# Altium footprint library HexapodRobot_STC15W4K48S4.PcbLib: 92 footprints (part 3 of 6)
Each footprint in its own frame and in the unit in brackets; x right, y up, seen from the top. Pads: shape width x height; smd on the part's side, far side on the other; paste and mask are expansions set on the pad; w line width, h text height; cw(c..) or ccw(c..) is an arc to the next point about the centre after c.
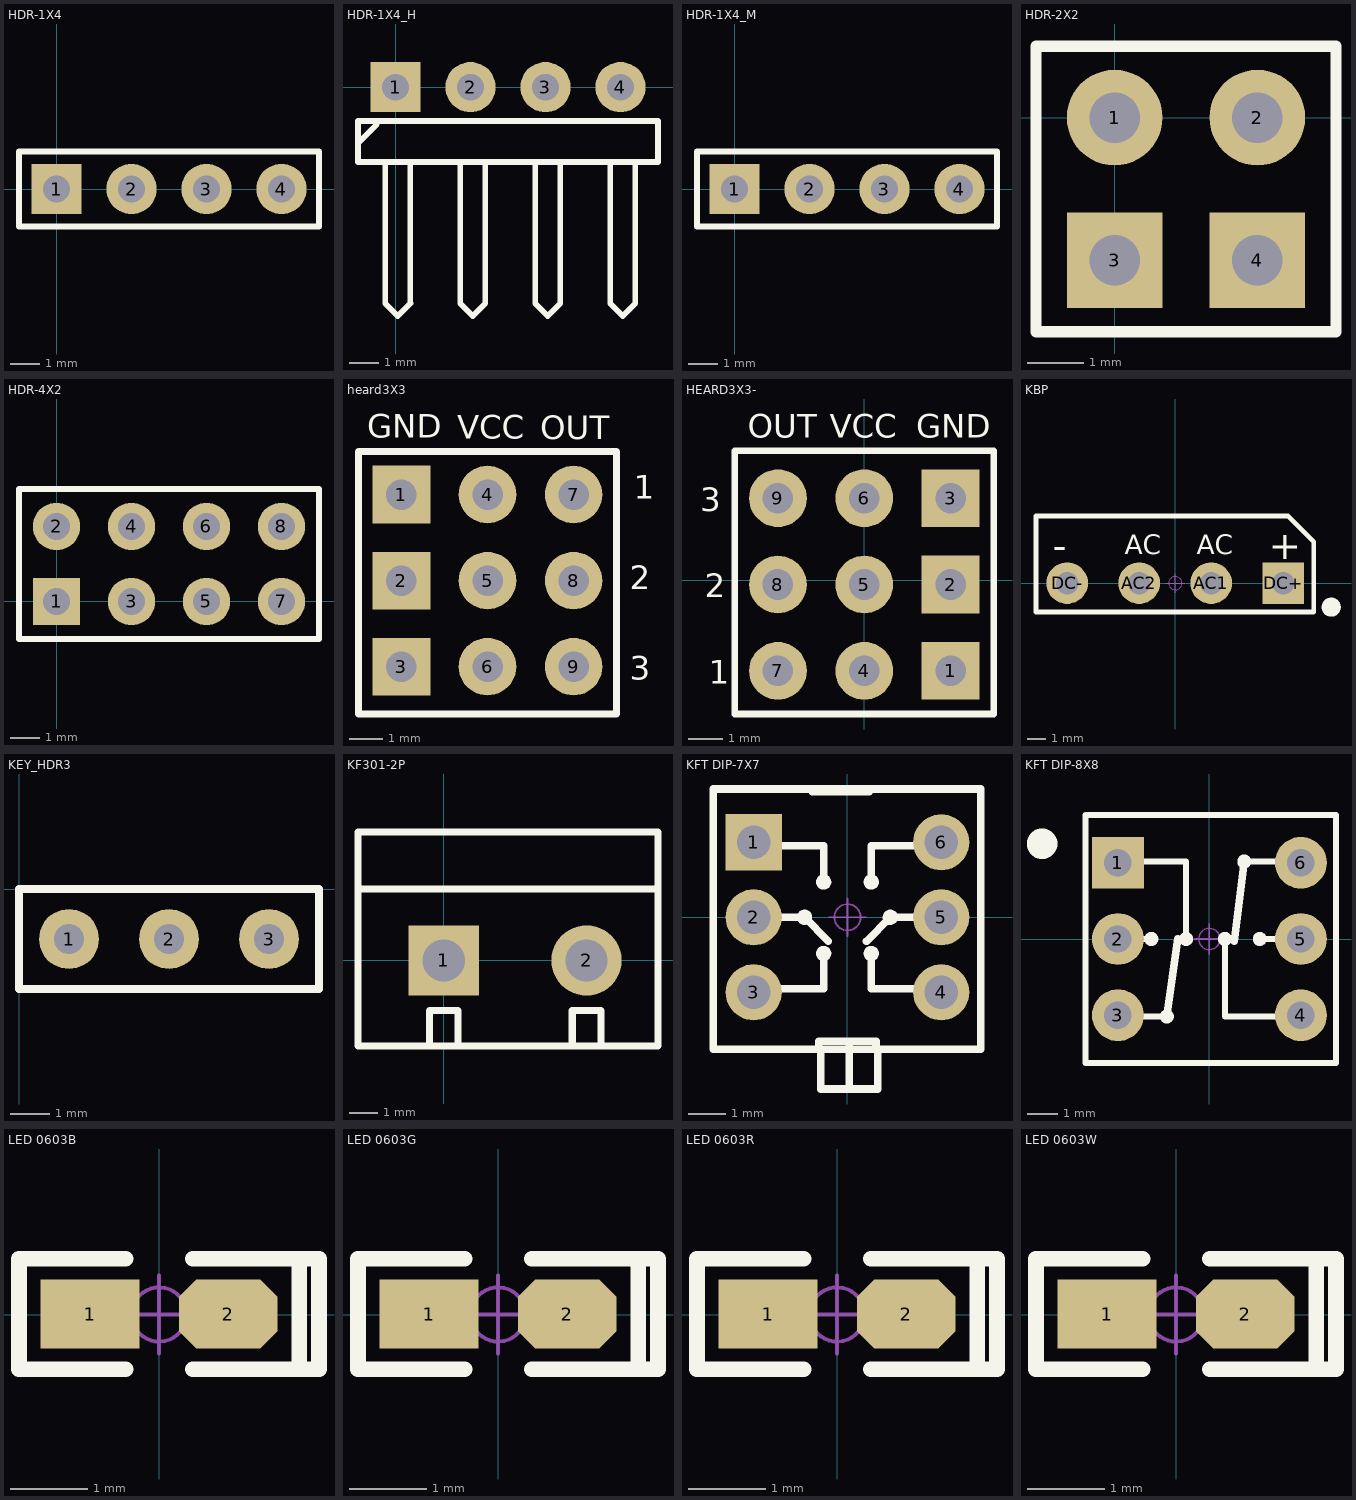
[diagram p2: the footprints below, top view; thin cyan lines are the x and y axes]

## HDR-1X4 [mm] "排针，4脚"
pads (4):
  rect 1.7x1.7 hole 0.9: 1(0,0)
  round 1.7 hole 0.9: 2(2.54,0) 3(5.08,0) 4(7.62,0)
Top Overlay:
  lines w0.2: -1.27,-1.27 -1.27,1.27 8.89,1.27 8.89,-1.27 -1.27,-1.27
3D body "HDR2.54-1P.STEP": height 8.5, standoff -3, extent -1.27,-1.27 1.27,1.27
3D body "HDR2.54-1P.STEP": height 8.5, standoff -3, extent 1.27,-1.27 3.81,1.27
3D body "HDR2.54-1P.STEP": height 8.5, standoff -3, extent 3.81,-1.27 6.35,1.27
3D body "HDR2.54-1P.STEP": height 8.5, standoff -3, extent 6.35,-1.27 8.89,1.27

## HDR-1X4_H [mm] "弯脚排针，4脚"
pads (4):
  rect 1.7x1.7 hole 0.9: 1(0,0)
  round 1.7 hole 0.9: 2(2.54,0) 3(5.08,0) 4(7.62,0)
Top Overlay:
  lines w0.2: -1.27,-1.905 -0.635,-1.27 ; -0.348,-2.54 -0.348,-7.332 0.075,-7.755 0.499,-7.332 0.508,-7.323 ; 0.499,-7.323 0.499,-2.54 ; 2.192,-2.54 2.192,-7.332 2.615,-7.755 3.039,-7.332 ; 3.039,-7.323 3.039,-2.54 ; 4.732,-2.54 4.732,-7.332 5.155,-7.755 5.579,-7.332 ; 5.579,-7.323 5.579,-2.54 ; 7.272,-2.54 7.272,-7.332 7.695,-7.755 8.119,-7.332 ; 8.119,-7.323 8.119,-2.54 ; -1.27,-2.54 -1.27,-1.143 0.508,-1.143 8.89,-1.143 8.89,-2.54 -1.27,-2.54
3D body "HDR2.54-1P_H.STEP": height 4.85, standoff -3, extent -1.27,-7.77 1.27,1.27
3D body "HDR2.54-1P_H.STEP": height 4.85, standoff -3, extent 1.27,-7.77 3.81,1.27
3D body "HDR2.54-1P_H.STEP": height 4.85, standoff -3, extent 3.81,-7.77 6.35,1.27
3D body "HDR2.54-1P_H.STEP": height 4.85, standoff -3, extent 6.35,-7.77 8.89,1.27

## HDR-1X4_M [mm] "排母，4脚"
pads (4):
  rect 1.7x1.7 hole 0.9: 1(0,0)
  round 1.7 hole 0.9: 2(2.54,0) 3(5.08,0) 4(7.62,0)
Top Overlay:
  lines w0.2: -1.27,-1.27 -1.27,1.27 8.89,1.27 8.89,-1.27 -1.27,-1.27
3D body "HDR2.54-1P_M.STEP": height 8.5, standoff -3, extent 1.27,-1.27 3.81,1.27
3D body "HDR2.54-1P_M.STEP": height 8.5, standoff -3, extent -1.27,-1.27 1.27,1.27
3D body "HDR2.54-1P_M.STEP": height 8.5, standoff -3, extent 6.35,-1.27 8.89,1.27
3D body "HDR2.54-1P_M.STEP": height 8.5, standoff -3, extent 3.81,-1.27 6.35,1.27

## HDR-2X2 [mm] "双排排针，2x2脚"
pads (4):
  round 1.7 hole 0.9: 1(0,0) 2(2.54,0)
  rect 1.7x1.7 hole 0.9: 3(0,-2.54) 4(2.54,-2.54)
Top Overlay:
  lines w0.2: -1.397,-3.81 -1.397,1.27 3.937,1.27 3.937,-3.81 -1.397,-3.81
3D body "HDR2.54-1P.STEP": height 8.5, standoff -3, extent 1.27,-1.27 3.81,1.27
3D body "HDR2.54-1P.STEP": height 8.5, standoff -3, extent 1.27,-3.81 3.81,-1.27
3D body "HDR2.54-1P.STEP": height 8.5, standoff -3, extent -1.27,-3.81 1.27,-1.27
3D body "HDR2.54-1P.STEP": height 8.5, standoff -3, extent -1.27,-1.27 1.27,1.27

## HDR-4X2 [mm] "双排排针，4x2脚"
pads (8):
  rect 1.6x1.6 hole 0.9: 1(0,0)
  round 1.6 hole 0.9: 2(0,2.54) 3(2.54,0) 4(2.54,2.54) 5(5.08,0) 6(5.08,2.54) 7(7.62,0) 8(7.62,2.54)
Top Overlay:
  lines w0.2: 1.482,-1.27 8.89,-1.27 8.89,3.81 -1.27,3.81 -1.27,-1.27 6.35,-1.27
3D body "HDR2.54-1x2P.STEP": height 8.5, standoff -3, extent 1.27,-1.27 3.81,3.81
3D body "HDR2.54-1x2P.STEP": height 8.5, standoff -3, extent -1.27,-1.27 1.27,3.81
3D body "HDR2.54-1x2P.STEP": height 8.5, standoff -3, extent 6.35,-1.27 8.89,3.81
3D body "HDR2.54-1x2P.STEP": height 8.5, standoff -3, extent 3.81,-1.27 6.35,3.81

## heard3X3 [mm]
pads (9):
  rect 1.7x1.7 hole 0.9: 1(10.541,-6.604) 2(10.541,-9.144) 3(10.541,-11.684)
  round 1.7 hole 0.9: 4(13.081,-6.604) 5(13.081,-9.144) 6(13.081,-11.684) 7(15.621,-6.604) 8(15.621,-9.144) 9(15.621,-11.684)
Top Overlay:
  lines w0.2: 9.271,-13.081 9.271,-5.334 16.891,-5.334 16.891,-13.081 9.271,-13.081
  text "VCC" at 12.192,-4.953 h0.7
  text "GND" at 9.525,-4.928 h0.7
  text "OUT" at 14.63,-4.978 h0.7
  text "1" at 17.399,-6.731 h0.7
  text "2" at 17.272,-9.398 h0.7
  text "3" at 17.272,-12.065 h0.7
3D body "HDR2.54-1P.STEP": height 8.5, standoff -3, extent 14.351,-7.874 16.891,-5.334
3D body "HDR2.54-1P.STEP": height 8.5, standoff -3, extent 11.811,-7.874 14.351,-5.334
3D body "HDR2.54-1P.STEP": height 8.5, standoff -3, extent 9.271,-7.874 11.811,-5.334
3D body "HDR2.54-1P.STEP": height 8.5, standoff -3, extent 14.351,-10.414 16.891,-7.874
3D body "HDR2.54-1P.STEP": height 8.5, standoff -3, extent 11.811,-10.414 14.351,-7.874
3D body "HDR2.54-1P.STEP": height 8.5, standoff -3, extent 9.271,-10.414 11.811,-7.874
3D body "HDR2.54-1P.STEP": height 8.5, standoff -3, extent 9.271,-12.954 11.811,-10.414
3D body "HDR2.54-1P.STEP": height 8.5, standoff -3, extent 11.811,-12.954 14.351,-10.414
3D body "HDR2.54-1P.STEP": height 8.5, standoff -3, extent 14.351,-12.954 16.891,-10.414

## HEARD3X3- [mm]
pads (9):
  rect 1.7x1.7 hole 0.9: 1(2.54,-2.667) 2(2.54,-0.127) 3(2.54,2.413)
  round 1.7 hole 0.9: 4(0,-2.667) 5(0,-0.127) 6(0,2.413) 7(-2.54,-2.667) 8(-2.54,-0.127) 9(-2.54,2.413)
Top Overlay:
  lines w0.2: -3.81,-3.937 3.81,-3.937 3.81,3.81 -3.81,3.81 -3.81,-3.937
  text "VCC" at -1.016,4.191 h0.7
  text "GND" at 1.524,4.191 h0.7
  text "OUT" at -3.429,4.191 h0.7
  text "1" at -4.572,-3.048 h0.7
  text "2" at -4.699,-0.508 h0.7
  text "3" at -4.826,2.032 h0.7
3D body "HDR2.54-1P.STEP": height 8.5, standoff -3, extent -3.81,-3.937 -1.27,-1.397
3D body "HDR2.54-1P.STEP": height 8.5, standoff -3, extent -1.27,-3.937 1.27,-1.397
3D body "HDR2.54-1P.STEP": height 8.5, standoff -3, extent 1.27,-3.937 3.81,-1.397
3D body "HDR2.54-1P.STEP": height 8.5, standoff -3, extent -3.81,-1.397 -1.27,1.143
3D body "HDR2.54-1P.STEP": height 8.5, standoff -3, extent -1.27,-1.397 1.27,1.143
3D body "HDR2.54-1P.STEP": height 8.5, standoff -3, extent 1.27,-1.397 3.81,1.143
3D body "HDR2.54-1P.STEP": height 8.5, standoff -3, extent 1.27,1.143 3.81,3.683
3D body "HDR2.54-1P.STEP": height 8.5, standoff -3, extent -1.27,1.143 1.27,3.683
3D body "HDR2.54-1P.STEP": height 8.5, standoff -3, extent -3.81,1.143 -1.27,3.683

## KBP [mm] "14.7*4.8*12.2mm(长宽高)"
pads (4):
  round 2.2 hole 1.2: AC1(1.9,0) AC2(-1.91,0) DC-(-5.72,0)
  rect 2.2x2.2 hole 1.2: DC+(5.71,0)
Top Overlay:
  circle w0.508: c8.25,-1.27 r0.254
  lines w0.254: -7.37,-1.524 -7.37,3.55 5.97,3.55 7.33,2.19 7.33,-1.524 -7.37,-1.524
  text "+" at 4.948,1.27 h1.5
  text "-" at -6.482,1.27 h1.5
  text "AC" at -2.672,1.524 h1.02
  text "AC" at 1.138,1.524 h1.02
Mechanical 15:
  circle w0.05: c0,0 r0.35
  lines w0.05: -0.5,0 0.5,0 ; 0,-0.5 0,0.5
3D body "KBP.STEP": height 11.7, standoff -3.1, extent -7.35,-1.25 7.35,3.55

## KEY_HDR3 [mil]
pads (3):
  round 60 hole 30: 1(50,-50) 2(150,-50) 3(250,-50)
Top Overlay:
  lines w7.87: 297.56,0 0,0 0,-100 300,-100 300,0

## KF301-2P [mm] "可拼接端子/6A"
pads (2):
  rect 2.5x2.5 hole 1.5: 1(0,0)
  round 2.5 hole 1.5: 2(5.08,0)
Top Overlay:
  lines w0.254: -3.048,2.54 7.62,2.54 ; -0.508,-3.048 -0.508,-1.778 0.508,-1.778 0.508,-3.048 ; 4.572,-3.048 4.572,-1.778 5.588,-1.778 5.588,-3.048 ; -3.048,-3.048 7.62,-3.048 7.62,4.572 -3.048,4.572 -3.048,-3.048
3D body "KF301.STEP": height 10.05, standoff -3.75, extent 2.13,-3 7.63,4.6
3D body "KF301.STEP": height 10.05, standoff -3.75, extent -2.87,-3 2.63,4.6

## KFT DIP-7X7 [mm] "自锁开关，规格：7*7mm"
pads (6):
  rect 1.5x1.5 hole 0.9: 1(-2.5,2)
  round 1.5 hole 0.9: 2(-2.5,0) 3(-2.5,-2) 4(2.5,-2) 5(2.5,0) 6(2.5,2)
Top Overlay:
  circle w0.254: c-1.143,0 r0.076
  circle w0.254: c1.143,0 r0.076
  circle w0.254: c-0.635,-0.965 r0.076
  circle w0.254: c0.635,-0.965 r0.076
  circle w0.254: c-0.635,0.94 r0.076
  circle w0.254: c0.635,0.94 r0.076
  lines w0.203: -2.54,-1.905 -1.524,-1.905 -0.635,-1.905 -0.635,-0.889 ; -2.54,0 -1.143,0 -0.508,-0.635 ; -2.54,1.905 -0.635,1.905 -0.635,1.016 ; -0.94,3.344 0.584,3.344 ; -0.762,-3.514 -0.762,-3.309 0.762,-3.309 0.762,-3.514 ; -0.712,-3.563 -0.712,-4.579 0.812,-4.579 0.812,-3.563 ; 0.05,-4.579 0.05,-3.436 ; 0.508,-0.635 1.143,0 2.54,0 ; 0.635,-0.889 0.635,-1.905 2.54,-1.905 ; 0.635,1.016 0.635,1.905 2.54,1.905 ; -3.581,-3.514 2.54,-3.514 3.556,-3.514 3.556,3.42 -3.581,3.42 -3.581,-3.514
Mechanical 15:
  circle w0.05: c0,0 r0.35
  lines w0.05: -0.5,0 0.5,0 ; 0,-0.5 0,0.5
3D body "SLSW 7x7.STEP": height 11.2, standoff -3.2, extent -3.5,-3.5 3.5,3.5

## KFT DIP-8X8 [mm] "自锁开关，规格：8*8mm"
pads (6):
  rect 1.7x1.7 hole 0.9: 1(-3,2.5)
  round 1.7 hole 0.9: 2(-3,0) 3(-3,-2.5) 4(3,-2.5) 5(3,0) 6(3,2.5)
Top Overlay:
  circle w0.254: c1.143,2.54 r0.102
  circle w0.254: c1.651,0 r0.102
  circle w0.254: c-1.905,0 r0.102
  circle w0.254: c-1.397,-2.54 r0.102
  circle w0.254: c0.508,0 r0.102
  circle w0.254: c-0.762,0 r0.102
  circle w0.6: c-5.486,3.124 r0.2
  lines w0.2: -4.064,-4.064 -4.064,4.064 4.153,4.064 4.153,-4.064 -4.064,-4.064
  lines w0.203: -3.048,-2.54 -1.397,-2.54 ; -3.048,0 -1.771,0 ; -3.048,2.54 -0.762,2.54 -0.762,0 ; 0.508,0 0.508,-2.54 2.794,-2.54 ; 1.143,2.54 2.794,2.54 ; 1.6,0 2.794,0
  lines w0.254: -1.397,-2.54 -1.041,0 ; 0.813,-0.076 1.143,2.54
Mechanical 15:
  circle w0.05: c0,0 r0.35
  lines w0.05: -0.5,0 0.5,0 ; 0,-0.5 0,0.5
3D body "SLSW 8x8.STEP": height 13.1, standoff -3.2, extent -3.949,-4.051 4.051,3.949

## LED 0603B [mil] "蓝色0603LED"
pads (2):
  rect 50x35 smd: 1(-35,0.26)
  oct 50x35 smd: 2(35,0.26)
Top Overlay:
  lines w8: -17,-27.74 -71,-27.74 -71,-25.74 -71,28.26 -70,28.26 -17,28.26 ; 17,-27.74 70,-27.74 ; 17,28.26 71,28.26 81,28.26 81,-27.74 71,-27.74 71,26.26
Mechanical 15:
  circle w1.97: c0,0 r13.78
  lines w1.97: -19.68,0 19.68,0 ; 0,-19.68 0,19.68
3D body "LED 0603玻璃罩.STEP": height 23.82, standoff 8.07, extent -23.58,-15.79 23.58,15.79
3D body "LED 0603-B.STEP": height 18.36, standoff -0.16, extent -31.49,-15.79 31.5,15.79

## LED 0603G [mil] "绿色0603LED"
pads (2):
  rect 50x35 smd: 1(-35,0.26)
  oct 50x35 smd: 2(35,0.26)
Top Overlay:
  lines w8: -17,-27.74 -71,-27.74 -71,-25.74 -71,28.26 -70,28.26 -17,28.26 ; 17,-27.74 70,-27.74 ; 17,28.26 71,28.26 81,28.26 81,-27.74 71,-27.74 71,26.26
Mechanical 15:
  circle w1.97: c0,0 r13.78
  lines w1.97: -19.68,0 19.68,0 ; 0,-19.68 0,19.68
3D body "LED 0603-G.STEP": height 18.36, standoff -0.16, extent -31.49,-15.79 31.5,15.79
3D body "LED 0603玻璃罩.STEP": height 23.82, standoff 8.07, extent -23.58,-15.79 23.58,15.79

## LED 0603R [mil] "红色0603LED"
pads (2):
  rect 50x35 smd: 1(-35,0.26)
  oct 50x35 smd: 2(35,0.26)
Top Overlay:
  lines w8: -17,-27.74 -71,-27.74 -71,-25.74 -71,28.26 -70,28.26 -17,28.26 ; 17,-27.74 70,-27.74 ; 17,28.26 71,28.26 81,28.26 81,-27.74 71,-27.74 71,26.26
Mechanical 15:
  circle w1.97: c0,0 r13.78
  lines w1.97: -19.68,0 19.68,0 ; 0,-19.68 0,19.68
3D body "LED 0603-R.STEP": height 18.36, standoff -0.16, extent -31.49,-15.79 31.5,15.79
3D body "LED 0603玻璃罩.STEP": height 23.82, standoff 8.07, extent -23.58,-15.79 23.58,15.79

## LED 0603W [mil] "白色0603LED"
pads (2):
  rect 50x35 smd: 1(-35,0.26)
  oct 50x35 smd: 2(35,0.26)
Top Overlay:
  lines w8: -17,-27.74 -71,-27.74 -71,-25.74 -71,28.26 -70,28.26 -17,28.26 ; 17,-27.74 70,-27.74 ; 17,28.26 71,28.26 81,28.26 81,-27.74 71,-27.74 71,26.26
Mechanical 15:
  circle w1.97: c0,0 r13.78
  lines w1.97: -19.68,0 19.68,0 ; 0,-19.68 0,19.68
3D body "LED 0603-W.STEP": height 18.36, standoff -0.16, extent -31.49,-15.79 31.5,15.79
3D body "LED 0603玻璃罩.STEP": height 23.82, standoff 8.07, extent -23.58,-15.79 23.58,15.79